# Altium footprint library Connector.PcbLib: 231 footprints (part 12 of 15)
Each footprint in its own frame and in the unit in brackets; x right, y up, seen from the top. Pads: shape width x height; smd on the part's side, far side on the other; paste and mask are expansions set on the pad; w line width, h text height; cw(c..) or ccw(c..) is an arc to the next point about the centre after c.
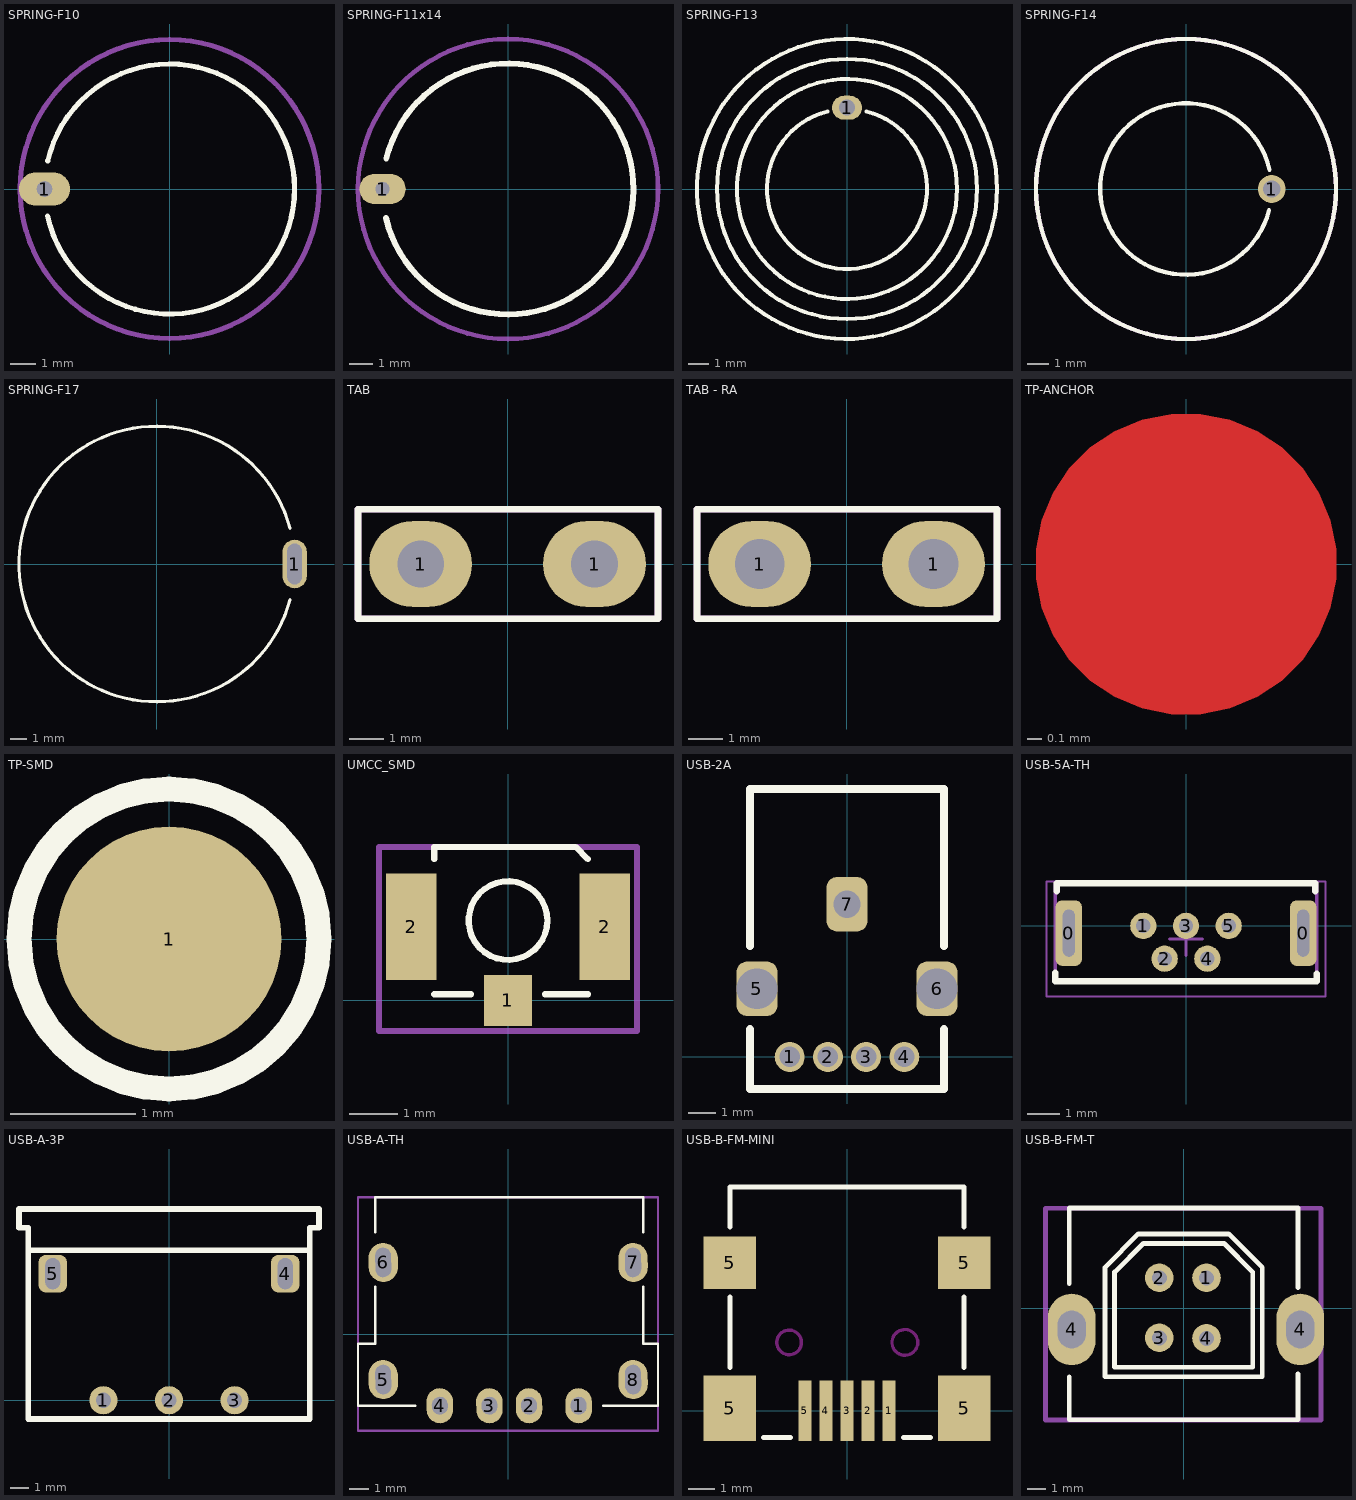
[diagram p11: the footprints below, top view; thin cyan lines are the x and y axes]

## SPRING-F10 [mm]
pads (1):
  oval 2x1.3 hole 0.6: 1(-4.9,0)
Top Overlay:
  lines w0.2: -4.786,-1.053 ccw(c0,0) 4.663,-1.504 ccw(c0,0) -4.774,1.105
Mechanical 13:
  circle w0.2: c0,0 r5.855
  text ".Designator" at -2.8,-0.422 h2
3D body "loxo.STEP": height 15.8, standoff -2, extent -5.092,-5.099 5.099,5.1

## SPRING-F11x14 [mm]
pads (1):
  oval 2x1.3 hole 0.6: 1(-5.4,0)
Top Overlay:
  lines w0.254: -5.253,-1.252 ccw(c0,0) -5.24,1.304
Mechanical 13:
  circle w0.2: c0,0 r6.455
  text ".Designator" at -2.8,-0.422 h2
3D body: height 14, standoff 0, extent -5.5,-5.5 5.5,5.5

## SPRING-F13 [mm]
pads (1):
  oval 1.5x1.2 hole 0.8: 1(0,4.064)
Top Overlay:
  circle w0.2: c0,0 r6.5
  circle w0.2: c0,0 r5.5
  circle w0.2: c0,0 r7.5
  lines w0.2: -0.97,3.881 ccw(c0,0) 0.97,3.881

## SPRING-F14 [mm]
pads (1):
  round 1.3 hole 0.8: 1(4,0)
Top Overlay:
  circle w0.2: c0,0 r7
  lines w0.2: 3.877,-0.994 cw(c0,0) 3.9,0.9
Mechanical 13:
  circle w0.2: c0,0 r7
  text ".Designator" at -5.2,-0.5 h2
Mechanical 15:
  circle w0.2: c0,0 r7
  text ".Comment" at -5.2,-0.5 h2

## SPRING-F17 [mm]
pads (1):
  oval 1.5x3 hole 2.5 slot 0.9 at 0 deg: 1(8.5,0)
Top Overlay:
  lines w0.2: 8.21,-2.2 cw(c0,0) 8.21,2.2
3D body "C0.02-0.67-0.6-1.5-C-0.39-0.39BeCuL.stp": height 15.24, standoff 0, extent -8.526,-8.509 8.521,8.509

## TAB [mm]
pads (2):
  oval 3x2.5 hole 1.36: 1(-2.54,0) 1(2.54,0)
Top Overlay:
  lines w0.2: -4.369,-1.6 -4.369,1.6 4.394,1.6 4.394,-1.6 -4.369,-1.6
Mechanical 13:
  lines w0.2: -4.369,-1.6 -4.369,1.6 4.394,1.6 4.394,-1.6 -4.369,-1.6
  text ".Designator" at -3.3,-0.3 h1.5
3D body "User Library-Tab_ 6_3x8_straight.step": height 10.9, standoff -3.3, extent -4,-0.4 4,0.4

## TAB - RA [mm]
pads (2):
  oval 3x2.5 hole 1.45: 1(-2.54,0) 1(2.54,0)
Top Overlay:
  lines w0.2: -4.369,-1.6 -4.369,1.6 4.394,1.6 4.394,-1.6 -4.369,-1.6
Mechanical 13:
  lines w0.2: -4.369,-1.6 -4.369,1.6 4.394,1.6 4.394,-1.6 -4.369,-1.6
  text ".Designator" at -3.3,-0.3 h1.5
3D body "TAB RA 6_3X0_8 FOR PCB.step": height 7.59, standoff -3.51, extent -2.921,-0.419 13.079,0.381

## TP-ANCHOR [mm] "Test Point SMD"
Top Layer:
  region: 0,0.5 0.099,0.5 0.283,0.424 0.424,0.283 0.5,0.099 0.5,0 0.5,-0.099 0.424,-0.283 0.283,-0.424 0.099,-0.5 0,-0.5 -0.099,-0.5 -0.283,-0.424 -0.424,-0.283 -0.5,-0.099 -0.5,0 -0.5,0.099 -0.424,0.283 -0.283,0.424 -0.099,0.5
  pour cut-out: 0,-1.02 -0.1,-1.02 -0.297,-0.981 -0.483,-0.904 -0.65,-0.792 -0.792,-0.65 -0.904,-0.483 -0.981,-0.297 -1.02,-0.1 -1.02,0 -1.02,0.1 -0.981,0.297 -0.904,0.483 -0.792,0.65 -0.65,0.792 -0.483,0.904 -0.297,0.981 -0.1,1.02 0,1.02 0.1,1.02 0.297,0.981 0.483,0.904 0.65,0.792 0.792,0.65 0.904,0.483 0.981,0.297 1.02,0.1 1.02,0 1.02,-0.1 0.981,-0.297 0.904,-0.483 0.792,-0.65 0.65,-0.792 0.483,-0.904 0.297,-0.981 0.1,-1.02
Top Solder:
  region: 0,-1.02 -0.1,-1.02 -0.297,-0.981 -0.483,-0.904 -0.65,-0.792 -0.792,-0.65 -0.904,-0.483 -0.981,-0.297 -1.02,-0.1 -1.02,0 -1.02,0.1 -0.981,0.297 -0.904,0.483 -0.792,0.65 -0.65,0.792 -0.483,0.904 -0.297,0.981 -0.1,1.02 0,1.02 0.1,1.02 0.297,0.981 0.483,0.904 0.65,0.792 0.792,0.65 0.904,0.483 0.981,0.297 1.02,0.1 1.02,0 1.02,-0.1 0.981,-0.297 0.904,-0.483 0.792,-0.65 0.65,-0.792 0.483,-0.904 0.297,-0.981 0.1,-1.02

## TP-SMD [mm] "Test Point SMD"
pads (1):
  round 1.8 smd: 1(0,0)
Top Overlay:
  circle w0.2: c0,0 r1.2

## UMCC_SMD [mm]
pads (3):
  rect 1x1.05 smd: 1(0,0)
  rect 1.05x2.2 smd: 2(-2,1.525) 2(2,1.525)
Top Overlay:
  circle w0.127: c0,1.651 r0.813
  lines w0.127: -1.524,0.127 -0.762,0.127 ; -1.524,2.921 -1.524,3.175 1.397,3.175 1.651,2.921 ; 0.762,0.127 1.651,0.127
Mechanical 13:
  lines w0.127: -2.667,-0.635 -2.667,3.175 2.667,3.175 2.667,-0.635 -2.667,-0.635
  text ".Designator" at -2.032,1.27 h0.64
Mechanical 15:
  lines w0.127: -2.667,-0.635 2.667,-0.635 2.667,3.175 -2.667,3.175 -2.667,-0.635
  text ".Comment" at -2.032,1.27 h0.64
3D body "User Library-U_FL-R-SMT(10).step": height 1.25, standoff 0, extent -1.5,-0.026 1.5,3.074

## USB-2A [mm]
pads (7):
  round 1.1 hole 0.75: 1(-2.1,0) 2(-0.7,0) 3(0.7,0) 4(2.1,0)
  rrect50% 1.5x2 hole 1.5 square: 5(-3.3,2.5) 6(3.3,2.5)
  rrect50% 1.5x2 hole 1 square: 7(0,5.6)
Top Overlay:
  lines w0.3: -3.56,1.016 -3.56,-1.172 -3.558,-1.173 ; -3.56,4.067 -3.56,9.825 3.559,9.825 3.556,9.822 3.556,4.064 ; -3.556,-1.172 -3.56,-1.175 3.553,-1.175 3.556,-1.172 3.556,1.016
3D body "Download_STP_614004184726 (rev1).stp": height 15.65, standoff -1.39, extent -3.56,-1.175 3.559,9.825

## USB-5A-TH [mm]
pads (7):
  rrect50% 0.8x2 hole 1.43 slot 0.36 at 0 deg: 0(-3.57,-0.22) 0(3.57,-0.22)
  round 0.8 hole 0.44: 1(-1.3,0) 2(-0.65,-1) 3(0,0) 4(0.65,-1) 5(1.3,0)
Top Overlay:
  lines w0.2: -3.98,-1.429 -3.98,-1.633 -3.98,-1.69 3.98,-1.69 ; -3.937,1.05 -3.937,1.3 3.923,1.3 ; 3.937,1.05 3.937,1.3 ; 3.98,-1.661 3.98,-1.458
Mechanical 13:
  lines w0.1: -3.98,-1.69 -3.98,1.3 3.98,1.3 3.98,-1.69 -3.98,-1.69
Mechanical 15:
  lines w0.05: -4.25,-2.15 -4.25,1.35 4.25,1.35 4.25,-2.15 -4.25,-2.15
  lines w0.1: -0.5,-0.4 0.5,-0.4 ; 0,-0.9 0,0.1
3D body "usb3131-30-0230-a_revb.step": height 5.64, standoff -2.27, extent -4.023,-1.633 3.923,1.3

## USB-A-3P [mm]
pads (5):
  round 1.5 hole 0.8: 1(-3.5,0) 2(0,0) 3(3.5,0)
  rrect50% 1.5x2 hole 1.65 slot 0.8 at 0 deg: 4(6.2,6.75) 5(-6.2,6.75)
Top Overlay:
  lines w0.3: -7.5,8 7.5,8 ; -8,9.2 -8,10.2 8,10.2 8,9.2 7.5,9.2 7.5,-1 -7.5,-1 -7.5,9.2 -8,9.2
3D body: height 6.88, standoff 0, extent -8,-1 8,10.2
3D body: height 7, standoff 6.88, extent -8,-1 8,10.2
3D body: height 1, standoff 0, extent -8,-1 8,10.2

## USB-A-TH [mm]
pads (8):
  oval 1.35x1.8 hole 0.8 slot 0.9 at 90.92 deg rot 0.92: 1(3.612,-3.67) 2(1.072,-3.67) 3(-0.96,-3.67) 4(-3.5,-3.67)
  oval 1.5x2 hole 0.8 slot 1.5 at 90.92 deg rot 0.92: 5(-6.4,-2.33) 6(-6.4,3.67) 7(6.4,3.67) 8(6.4,-2.33)
Top Overlay:
  lines w0.127: -6.802,2.426 -6.802,-0.495 -7.691,-0.495 -7.691,-3.67 -4.77,-3.67 ; -6.802,5.22 -6.802,6.998 6.914,6.998 6.914,5.22 ; 4.882,-3.67 7.676,-3.67 7.676,-0.495 6.914,-0.495 6.914,2.426
Mechanical 13:
  lines w0.127: -7.691,-4.94 -7.691,6.998 7.676,6.998 7.676,-4.94 -7.691,-4.94
  text ".Designator" at -1.27,0 h0.64
Mechanical 15:
  lines w0.127: -7.691,-4.94 -7.691,6.998 7.676,6.998 7.676,-4.94 -7.691,-4.94
  text ".Comment" at -0.96,0 h0.64
3D body: height 5.8, standoff 0, extent -7.691,-3.67 7.676,6.998

## USB-B-FM-MINI [mm]
height 3.9
pads (9):
  rect 0.5x2.3 smd mask+0.025: 1(1.6,0) 2(0.8,0) 3(0,0) 4(-0.8,0) 5(-1.6,0)
  rect 2x2.5 smd mask+0: 5(-4.45,0.1) 5(4.45,0.1)
  rect 2x2 smd mask+0: 5(-4.45,5.631) 5(4.45,5.631)
Top Overlay:
  lines w0.2: -4.445,1.651 -4.445,4.318 ; -4.445,6.985 -4.445,8.509 4.445,8.509 4.445,6.985 ; -3.175,-1.016 -2.159,-1.016 ; 2.159,-1.016 3.175,-1.016 ; 4.445,1.651 4.445,4.318
Keep-Out Layer:
  circle w0.127: c2.2,2.6 r0.49
  circle w0.127: c-2.2,2.6 r0.468
3D body "User Library-USB_mini_B.STEP": height 3.95, standoff -1, extent -5.35,-0.7 5.35,8.5

## USB-B-FM-T [mil]
pads (6):
  round 60 hole 31.5 mask+2: 1(48,63.5) 2(-51,63.5) 3(-51,-62.5) 4(48,-63.5)
  oval 100x150 hole 59.06 slot 78.74 at 90 deg mask+2: 4(-235,-45) 4(245,-45)
Top Overlay:
  lines w5: -240,-144.5 -240,-234.5 240,-234.5 ; -240,185.5 -240,210 240,210 ; -165,-234.5 125,-234.5 ; -165,-144.5 -165,85.5 -95,155.5 65,155.5 95,155.5 165,85.5 165,-144.5 -165,-144.5 ; -145,-124.5 145,-124.5 145,75.5 85,135.5 -85,135.5 -145,75.5 -145,-124.5
  lines w10: -240.16,51.18 -240,51.34 -240,185.5 -240,210 240,210 240,43.46 240.16,43.31 ; -240,-144.5 -240,-234.5 240,-234.5 240,-137.95 240.16,-137.8 ; -165,-144.5 -165,85.5 -95,155.5 95,155.5 165,85.5 165,-144.5 -165,-144.5 ; -145,-124.5 145,-124.5 145,75.5 85,135.5 -85,135.5 -145,75.5 -145,-124.5
Mechanical 13:
  lines w10: -290.12,-235.13 -290.12,209.76 288.62,209.76 288.62,-235.13 -290.12,-235.13
Mechanical 15:
  lines w10: -290.12,-235.13 -290.12,209.76 288.62,209.76 288.62,-235.13 -290.12,-235.13
3D body "usb_a-usb_b-top-c.stp": height 633.86, standoff -155.36, extent -290.12,-235.13 288.62,209.76